# Altium footprint library Fleet-Monitor.PcbLib: 30 footprints (part 2 of 2)
Each footprint in its own frame and in the unit in brackets; x right, y up, seen from the top. Pads: shape width x height; smd on the part's side, far side on the other; paste and mask are expansions set on the pad; w line width, h text height; cw(c..) or ccw(c..) is an arc to the next point about the centre after c.
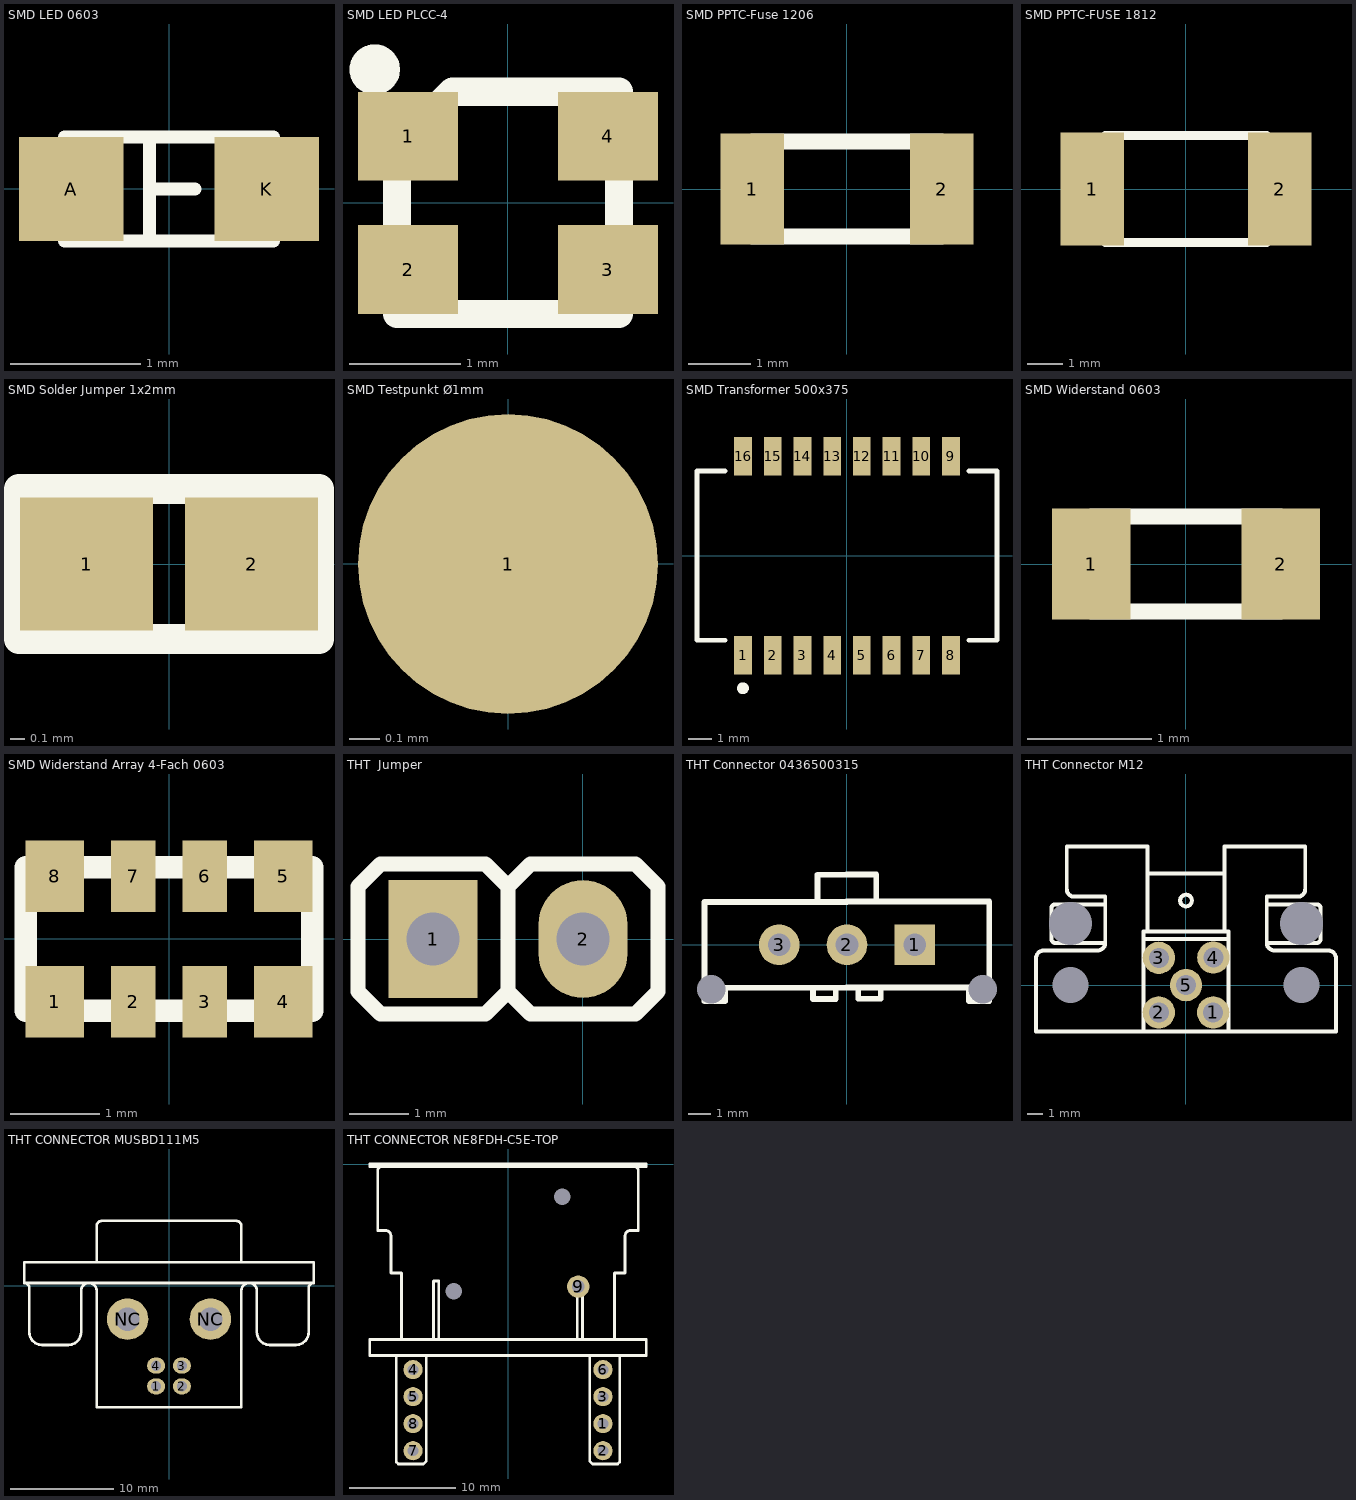
[diagram p1: the footprints below, top view; thin cyan lines are the x and y axes]

## SMD LED 0603 [mm] "SMD_LED_RED"
height 8.65
pads (2):
  rect 0.8x0.8 smd: A(-0.75,0) K(0.75,0)
Top Overlay:
  lines w0.1: -0.15,-0.4 -0.15,0.4 ; -0.15,0 0.2,0 ; -0.8,-0.4 0.8,-0.4 0.8,0.4 -0.8,0.4 -0.8,-0.4
3D body "User Library-LED SMD0603.step": height 0.68, standoff 0, extent -0.808,-0.368 0.842,0.357

## SMD LED PLCC-4 [mm] "SMD_LED_RED"
height 8.65
pads (4):
  rect 0.9x0.8 smd: 1(-0.9,0.6) 2(-0.9,-0.6) 3(0.9,-0.6) 4(0.9,0.6)
Top Overlay:
  circle w0.254: c-1.2,1.2 r0.1
  lines w0.254: -1,-1 -1,0.5 -0.5,1 1,1 1,-1 -1,-1
3D body "CLVBA-FKA.STEP": height 0.91, standoff 0.01, extent -1,-1 1,1

## SMD PPTC-Fuse 1206 [mil]
height 66.93
pads (2):
  rect 40x70 smd: 1(-60,0) 2(60,0)
Top Overlay:
  lines w10: -60,-30 60,-30 60,30 -60,30 -60,-30
3D body "User Library-Fuse1206.step": height 22.44, standoff -0.39, extent -63.03,-32.88 63.03,32.87

## SMD PPTC-FUSE 1812 [mm]
pads (2):
  rect 1.78x3.15 smd: 1(-2.615,0) 2(2.615,0)
Top Overlay:
  lines w0.254: -2.25,-1.5 2.25,-1.5 2.25,1.5 -2.25,1.5 -2.25,-1.5
3D body "User Library-0ZCG-0_90mm.step": height 0.55, standoff 0.05, extent -2.25,-1.6 2.25,1.6

## SMD Solder Jumper 1x2mm [mm] "SOT-223/SC-73; 4 Leads; Body 6.7 x 7.3 mm, inc. leads (LxW max)"
height 1.8
pads (2):
  rect 0.9x0.9 smd: 1(-0.559,0) 2(0.559,0)
Top Overlay:
  lines w0.2: -1.016,-0.508 -1.016,0.508 1.016,0.508 1.016,-0.508 -1.016,-0.508

## SMD Testpunkt Ø1mm [mm]
pads (1):
  round 1 smd: 1(0,0)

## SMD Transformer 500x375 [mm]
height 1.7
pads (16):
  rect 0.76x1.65 smd: 1(-4.445,-4.255) 2(-3.175,-4.255) 3(-1.905,-4.255) 4(-0.635,-4.255) 5(0.635,-4.255) 6(1.905,-4.255) 7(3.175,-4.255) 8(4.445,-4.255) 9(4.445,4.255) 10(3.175,4.255) 11(1.905,4.255) 12(0.635,4.255) 13(-0.635,4.255) 14(-1.905,4.255) 15(-3.175,4.255) 16(-4.445,4.255)
Top Overlay:
  circle w0.25: c-4.45,-5.67 r0.125
  lines w0.2: -5.2,-3.62 -6.415,-3.62 -6.415,3.62 -5.2,3.62 ; 5.2,-3.62 6.415,-3.62 6.415,3.62 5.2,3.62
3D body "Trans_Pulse_Electronics_Corporation_H1102NL_eec.STEP": height 0.25, standoff 0, extent -6.515,-5.18 6.515,5.18

## SMD Widerstand 0603 [mil]
height 66.93
pads (2):
  rect 25x35 smd: 1(-30,0) 2(30,0)
Top Overlay:
  lines w5: -30,-15 -30,15 30,15 30,-15 -30,-15
3D body "User Library-Panasonic0603.step": height 17.72, standoff 0, extent -31.5,-16.14 31.5,16.14

## SMD Widerstand Array 4-Fach 0603 [mm]
pads (8):
  rect 0.65x0.8 smd: 1(-1.275,-0.7) 4(1.275,-0.7) 5(1.275,0.7) 8(-1.275,0.7)
  rect 0.5x0.8 smd: 2(-0.4,-0.7) 3(0.4,-0.7) 6(0.4,0.7) 7(-0.4,0.7)
Top Overlay:
  lines w0.254: -1.6,-0.8 -1.6,0.8 1.6,0.8 1.6,-0.8 -1.6,-0.8
3D body "User Library-R-0603-Array-4-1.step": height 0.51, standoff -0.01, extent -1.6,-0.8 1.6,0.8

## THT  Jumper [mm]
pads (2):
  rect 1.5x2 hole 0.9: 1(-2.54,0)
  oval 1.5x2 hole 0.9: 2(0,0)
Top Overlay:
  lines w0.254: -1.27,-0.889 -1.27,0.762 -1.27,0.889 ; -1.27,-0.889 -1.651,-1.27 -3.429,-1.27 -3.81,-0.889 -3.81,0.889 -3.429,1.27 -1.651,1.27 -1.27,0.889 ; -1.27,-0.889 -0.889,-1.27 0.889,-1.27 1.27,-0.889 1.27,0.889 0.889,1.27 -0.889,1.27 -1.27,0.889
3D body "Jumper Closed.stp": height 8.72, standoff -3.05, extent -3.81,-1.273 1.27,1.267

## THT Connector 0436500315 [mm]
pads (5):
  rect 1.8x1.8 hole 1: 1(3,0)
  round 1.8 hole 1: 2(0,0) 3(-3,0)
  round 0 hole 1.27 unplated: NC(-6,-1.96) NC(6,-1.96)
Top Overlay:
  lines w0.254: -1.5,-1.9 -1.5,-2.4 -0.5,-2.4 -0.5,-1.9 ; -1.3,1.9 -1.3,3.1 0,3.1 ; -0.007,-1.888 5.393,-1.888 5.393,-2.488 6.293,-2.488 6.293,1.912 -0.007,1.912 ; -0.007,3.112 1.293,3.112 1.293,1.912 ; 0,-1.9 -5.4,-1.9 -5.4,-2.5 -6.3,-2.5 -6.3,1.9 0,1.9 ; 0.493,-1.888 0.493,-2.388 1.493,-2.388 1.493,-1.888
3D body "436500315.STEP": height 9.95, standoff -3.13, extent -6.325,-2.47 6.325,3.135

## THT Connector M12 [mm]
pads (9):
  round 2.1 hole 1.3: 1(1.77,-1.77) 2(-1.77,-1.77) 3(-1.765,1.779) 4(1.775,1.794) 5(0,0)
  round 0 hole 2.35 unplated: NC(-7.5,0) NC(7.5,0)
  round 0 hole 2.8 unplated: NC(-7.5,4) NC(7.5,4)
Top Overlay:
  circle w0.254: c0,5.5 r0.381
  lines w0.254: -5.25,5.25 -8.5,5.25 ccw(c-8.5,5) -8.75,5 -8.75,3 ccw(c-8.5,3) -8.5,2.75 -5.25,2.75 ; -2.75,-3 -2.75,3 ; -2.5,3.5 -2.5,7.25 ; 2.5,3.5 2.5,7.25 ; 2.75,-3 2.75,3 ; 5.25,5.25 8.5,5.25 cw(c8.5,5) 8.75,5 8.75,3 cw(c8.5,3) 8.5,2.75 5.25,2.75 ; -5.25,2.75 cw(c-5.75,2.75) -5.75,2.25 -9.25,2.25 ccw(c-9.25,1.75) -9.75,1.75 -9.75,-3 0,-3 9.75,-3 9.75,1.75 ccw(c9.25,1.75) 9.25,2.25 5.75,2.25 cw(c5.75,2.75) 5.25,2.75 ; -5.25,2.75 ccw(c-5.25,2.75) -5.25,2.75 ; -5.25,2.75 -5.25,5.75 -7.25,5.75 cw(c-7.25,6.25) -7.75,6.25 -7.75,9 -2.5,9 -2.5,7.25 ; -2.75,3 -2.75,3.5 0,3.5 2.75,3.5 2.75,3 ; -2.75,3 0,3 2.75,3 ; -2.5,7.25 0,7.25 2.5,7.25 ; 2.5,7.25 2.5,9 7.75,9 7.75,6.25 cw(c7.25,6.25) 7.25,5.75 5.25,5.75 5.25,2.75 ; 5.25,2.75 ccw(c5.25,2.75) 5.25,2.75
3D body "T4145015021-001 Plastic.STEP": height 15.5, standoff -3.6, extent -9.75,-3 9.75,23
3D body "Inside Nut.STEP": height 16, standoff 1, extent -8.636,7.006 8.636,14.806
3D body "Outside Nut.STEP": height 15.5, standoff 1.5, extent -7.49,12.5 7.49,22

## THT CONNECTOR MUSBD111M5 [mm]
pads (6):
  oval 1.75x1.55 hole 1: 1(-1.25,-9.74) 2(1.25,-9.74) 3(1.25,-7.74) 4(-1.25,-7.74)
  round 4 hole 2.3: NC(-4,-3.25) NC(4,-3.25)
Top Overlay:
  lines w0.254: -7,2.25 -7,5.75 cw(c-6.5,5.75) -6.5,6.25 0,6.25 6.5,6.25 cw(c6.5,5.75) 7,5.75 7,2.25 ; -14,0.25 cw(c-14,-0.25) -13.5,-0.25 -13.5,-4.5 ccw(c-12.25,-4.5) -12.25,-5.75 -9.75,-5.75 ccw(c-9.75,-4.5) -8.5,-4.5 -8.5,-0.5 cw(c-7.75,-0.5) -7,-0.5 -7,-11.75 0,-11.75 7,-11.75 7,-0.5 cw(c7.75,-0.5) 8.5,-0.5 8.5,-4.5 ccw(c9.75,-4.5) 9.75,-5.75 12.25,-5.75 ccw(c12.25,-4.5) 13.5,-4.5 13.5,-0.25 cw(c14,-0.25) 14,0.25 ; -14,0.25 0,0.25 14,0.25 ; -14,0.25 -14,2.25 0,2.25 14,2.25 14,0.25
3D body "M-MUSB-D111-31-REVT1_Rubber.STEP": height 10, standoff -58.5, extent -18,0.25 -4,8.5
3D body "M-MUSB-D111-31-REVT1_Body.STEP": height 15.51, standoff -2.49, extent -14,-11.75 14,6.25

## THT CONNECTOR NE8FDH-C5E-TOP [mm]
pads (11):
  round 1.8 hole 1: 1(8.925,-24.4) 2(8.925,-26.94) 3(8.925,-21.86) 4(-8.925,-19.32) 5(-8.925,-21.86) 6(8.925,-19.32) 7(-8.925,-26.94) 8(-8.925,-24.4)
  round 2.1 hole 1.2: 9(6.595,-11.52)
  round 0 hole 1.55 unplated: NC(-5.08,-11.955) NC(5.08,-3.06)
Top Overlay:
  lines w0.254: -10.5,-18 -10.5,-28 -10.31,-28.19 -8.675,-28.19 ; -10,-16.5 -10,-10.25 ; -10,-10.242 -11,-10.242 -11,-6.75 ccw(c-11.5,-6.75) -11.5,-6.25 -12.25,-6.25 -12.25,-0.5 -12,-0.25 ; -9.175,-28.19 -7.94,-28.19 -7.675,-27.925 -7.675,-18 ; -7,-16.5 -7,-11 -6.5,-11 -6.5,-16.5 ; 6.5,-16.5 6.5,-11 7,-11 7,-16.5 ; 7.675,-18 7.675,-27.925 7.94,-28.19 9.175,-28.19 ; 8.675,-28.19 10.31,-28.19 10.5,-28 10.5,-18 ; 10,-16.5 10,-10.25 ; 10,-10.242 11,-10.242 11,-6.75 cw(c11.5,-6.75) 11.5,-6.25 12.25,-6.25 12.25,-0.5 12,-0.25 ; -12,-0.25 -13,-0.25 -13,0 0,0 13,0 13,-0.25 12,-0.25 ; -12,-0.25 0,-0.25 12,-0.25 ; -13,-18 0,-18 13,-18 13,-16.5 0,-16.5 -13,-16.5 -13,-18
3D body "NE8FDH-C5E-TOP.STEP": height 28, standoff -5.72, extent -13,-28.205 13,6.555
3D body "rubber seal.SLDPRT": height 30.1, standoff -40.63, extent -13,2.1 13,12.5
3D body "NE8FDH-C5E-TOP_Flange.STEP": height 30.1, standoff -3, extent -13,4.6 13,12.5